# Altium footprint library 3D封装库.PcbLib: 716 footprints (part 10 of 45)
Each footprint in its own frame and in the unit in brackets; x right, y up, seen from the top. Pads: shape width x height; smd on the part's side, far side on the other; paste and mask are expansions set on the pad; w line width, h text height; cw(c..) or ccw(c..) is an arc to the next point about the centre after c.
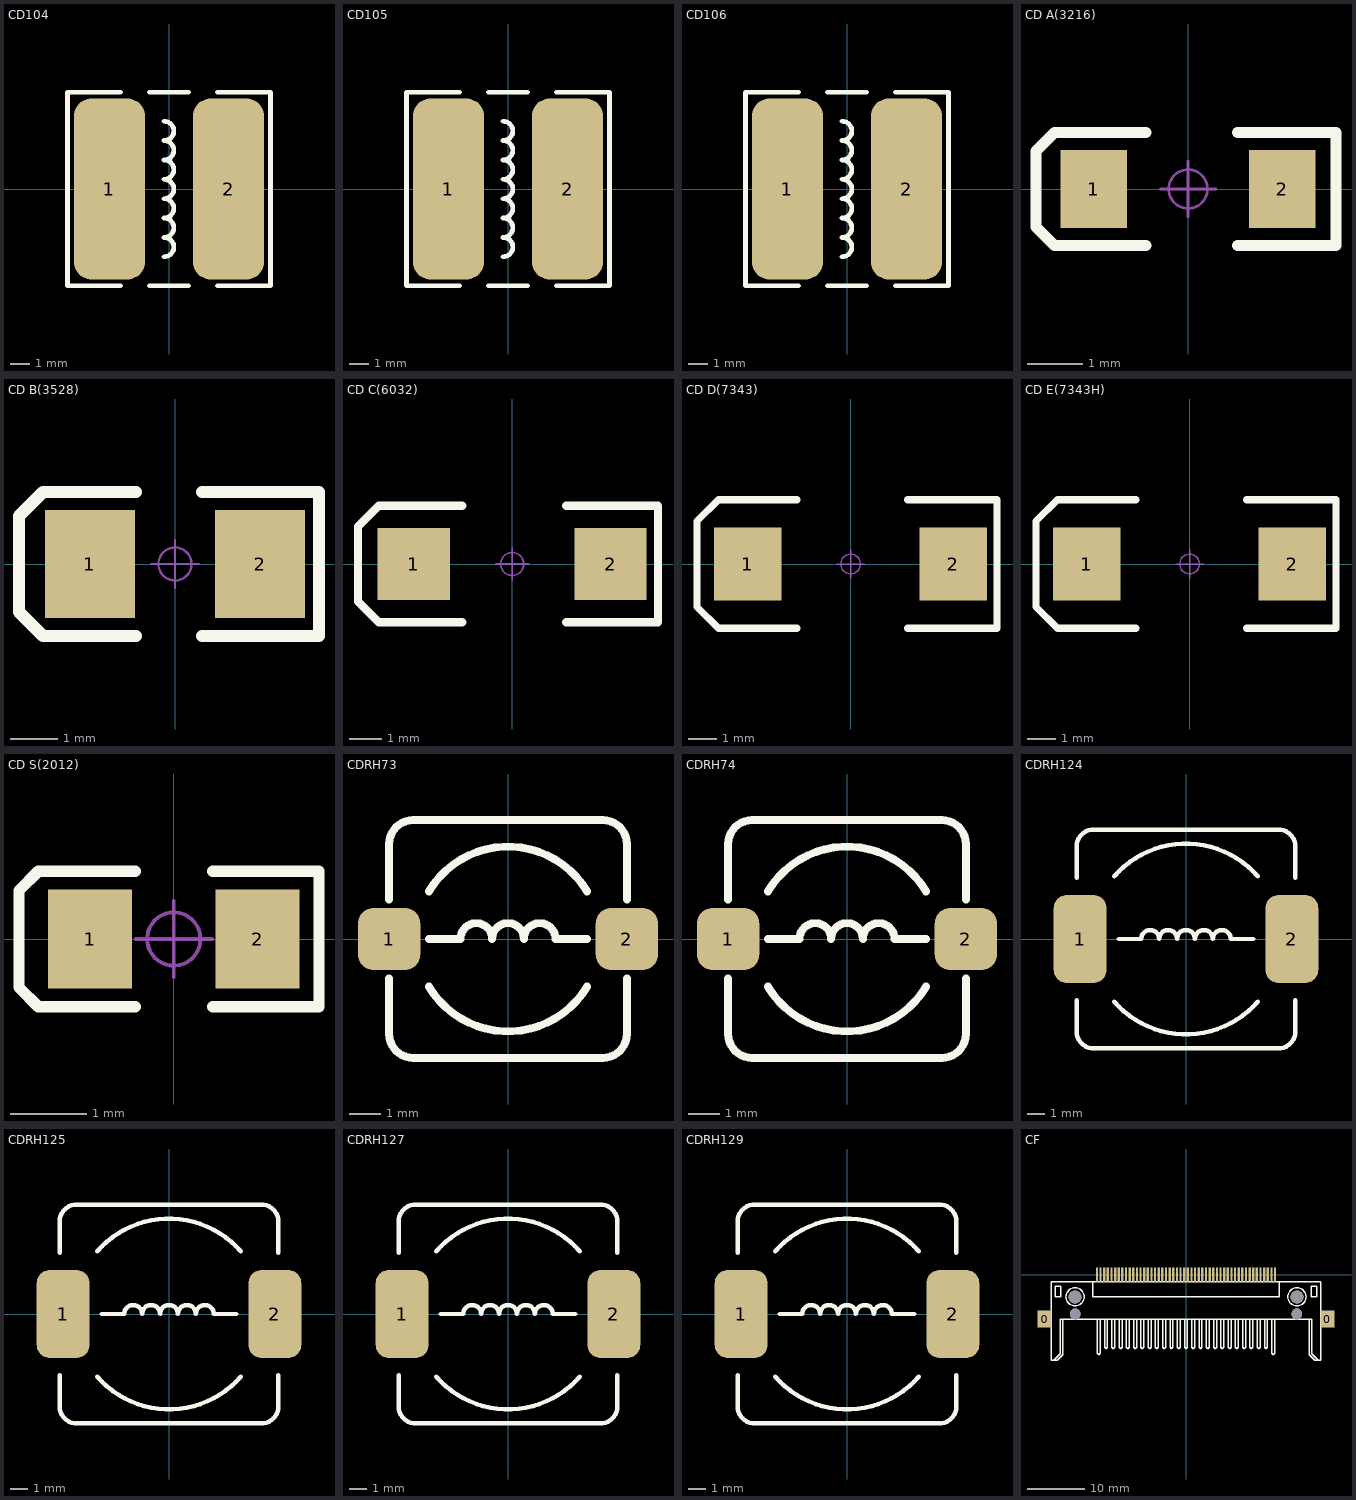
[diagram p9: the footprints below, top view; thin cyan lines are the x and y axes]

## CD104 [mm] "10*9*4mm（长宽高）"
pads (2):
  rrect50% 3.75x9.5 smd: 1(-3.125,0) 2(3.125,0)
Top Overlay:
  lines w0.254: -2.54,-5.08 -5.334,-5.08 -5.334,5.08 -2.54,5.08 ; -1.016,-5.08 1.016,-5.08 ; -1.016,5.08 1.016,5.08 ; -0.254,-3.556 ccw(c-0.254,-3.048) -0.254,-2.54 ccw(c-0.254,-2.032) -0.254,-1.524 ccw(c-0.254,-1.016) -0.254,-0.508 ccw(c-0.254,0) -0.254,0.508 ccw(c-0.254,1.016) -0.254,1.524 ccw(c-0.254,2.032) -0.254,2.54 ccw(c-0.254,3.048) -0.254,3.556 ; 2.54,-5.08 5.334,-5.08 5.334,5.08 2.54,5.08
3D body "CD104.STEP": height 4.7, standoff 0, extent -4.954,-4.5 4.954,4.5

## CD105 [mm] "10*9*5.4mm（长宽高）"
pads (2):
  rrect50% 3.75x9.5 smd: 1(-3.125,0) 2(3.125,0)
Top Overlay:
  lines w0.254: -2.54,-5.08 -5.334,-5.08 -5.334,5.08 -2.54,5.08 ; -1.016,-5.08 1.016,-5.08 ; -1.016,5.08 1.016,5.08 ; -0.254,-3.556 ccw(c-0.254,-3.048) -0.254,-2.54 ccw(c-0.254,-2.032) -0.254,-1.524 ccw(c-0.254,-1.016) -0.254,-0.508 ccw(c-0.254,0) -0.254,0.508 ccw(c-0.254,1.016) -0.254,1.524 ccw(c-0.254,2.032) -0.254,2.54 ccw(c-0.254,3.048) -0.254,3.556 ; 2.54,-5.08 5.334,-5.08 5.334,5.08 2.54,5.08
3D body "CD105.STEP": height 5.5, standoff 0, extent -4.954,-4.5 4.954,4.5

## CD106 [mm] "10*9*6.5mm（长宽高）"
pads (2):
  rrect50% 3.75x9.5 smd: 1(-3.125,0) 2(3.125,0)
Top Overlay:
  lines w0.254: -2.54,-5.08 -5.334,-5.08 -5.334,5.08 -2.54,5.08 ; -1.016,-5.08 1.016,-5.08 ; -1.016,5.08 1.016,5.08 ; -0.254,-3.556 ccw(c-0.254,-3.048) -0.254,-2.54 ccw(c-0.254,-2.032) -0.254,-1.524 ccw(c-0.254,-1.016) -0.254,-0.508 ccw(c-0.254,0) -0.254,0.508 ccw(c-0.254,1.016) -0.254,1.524 ccw(c-0.254,2.032) -0.254,2.54 ccw(c-0.254,3.048) -0.254,3.556 ; 2.54,-5.08 5.334,-5.08 5.334,5.08 2.54,5.08
3D body "CD106.STEP": height 6.3, standoff 0, extent -4.954,-4.5 4.954,4.5

## CD A(3216) [mm] "长3.2mm，宽1.6mm，厚1.6mm"
pads (2):
  rect 1.2x1.4 smd: 1(-1.7,0) 2(1.7,0)
Top Overlay:
  lines w0.2: -0.762,-1.016 -2.413,-1.016 -2.743,-0.686 -2.743,0.686 -2.413,1.016 -0.762,1.016 ; 0.889,-1.016 2.667,-1.016 2.667,1.016 0.889,1.016
Mechanical 15:
  circle w0.05: c0,0 r0.35
  lines w0.05: -0.5,0 0.5,0 ; 0,-0.5 0,0.5
3D body "CD A(3216).STEP": height 1.6, standoff -0.01, extent -1.6,-0.8 1.6,0.8

## CD B(3528) [mil] "长3.5mm，宽2.8mm，厚1.9mm"
pads (2):
  rect 75x90 smd: 1(-70.87,-0.01) 2(70.86,-0.01)
Top Overlay:
  lines w10: -32.51,-60 -110,-60 -130,-40 -130,40 -110,60 -32.51,60 ; 22.49,-60 120,-60 120,60 22.49,60
Mechanical 15:
  circle w1.97: c0,0 r13.78
  lines w1.97: -19.68,0 19.68,0 ; 0,-19.68 0,19.68
3D body "CD B(3528).STEP": height 74.84, standoff -0.3, extent -68.92,-55.12 68.91,55.11

## CD C(6032) [mm] "长6.0mm，宽3.2mm，厚2.5mm"
pads (2):
  rect 2.2x2.2 smd: 1(-3,0) 2(3,0)
Top Overlay:
  lines w0.254: -1.524,-1.778 -4.064,-1.778 -4.699,-1.143 -4.699,1.143 -4.064,1.778 -1.524,1.778 ; 1.651,-1.778 4.445,-1.778 4.445,1.778 1.651,1.778
Mechanical 15:
  circle w0.05: c0,0 r0.35
  lines w0.05: -0.5,0 0.5,0 ; 0,-0.5 0,0.5
3D body "CD C(6032).STEP": height 2.5, standoff -0.01, extent -3,-1.6 3,1.6

## CD D(7343) [mm] "长7.3mm，宽4.3mm，厚2.8mm"
pads (2):
  rect 2.4x2.6 smd: 1(-3.65,0) 2(3.65,0)
Top Overlay:
  lines w0.254: -1.905,-2.286 -4.699,-2.286 -5.461,-1.524 -5.461,1.524 -4.699,2.286 -1.905,2.286 ; 2.032,-2.286 5.207,-2.286 5.207,2.286 2.032,2.286
Mechanical 15:
  circle w0.05: c0,0 r0.35
  lines w0.05: -0.5,0 0.5,0 ; 0,-0.5 0,0.5
3D body "CD D(7343H).STEP": height 2.8, standoff -0.01, extent -3.65,-2.15 3.65,2.15

## CD E(7343H) [mm] "长7.3mm，宽4.3mm，厚4.0mm"
pads (2):
  rect 2.4x2.6 smd: 1(-3.65,0) 2(3.65,0)
Top Overlay:
  lines w0.254: -1.905,-2.286 -4.699,-2.286 -5.461,-1.524 -5.461,1.524 -4.699,2.286 -1.905,2.286 ; 2.032,-2.286 5.207,-2.286 5.207,2.286 2.032,2.286
Mechanical 15:
  circle w0.05: c0,0 r0.35
  lines w0.05: -0.5,0 0.5,0 ; 0,-0.5 0,0.5
3D body "CD E(7343H).STEP": height 4, standoff -0.01, extent -3.65,-2.15 3.65,2.15

## CD S(2012) [mm] "长2.0mm，宽1.25mm，厚1.2mm"
pads (2):
  rect 1.1x1.3 smd: 1(-1.1,0) 2(1.1,0)
Top Overlay:
  lines w0.15: -0.508,-0.889 -1.778,-0.889 -2.032,-0.635 -2.032,0.254 -2.032,0.635 -1.778,0.889 -0.508,0.889 ; 0.508,-0.889 1.905,-0.889 1.905,0.889 0.508,0.889
Mechanical 15:
  circle w0.05: c0,0 r0.35
  lines w0.05: -0.5,0 0.5,0 ; 0,-0.5 0,0.5
3D body "CD S(2012).STEP": height 1.2, standoff 0, extent -1,-0.6 1,0.6

## CDRH73 [mm] "7.3*7.3*3.4mm（长宽高）"
pads (2):
  rrect50% 2x2 smd: 1(-3.81,0) 2(3.81,0)
Top Overlay:
  lines w0.254: -3.81,-1.27 -3.81,-3.048 ccw(c-3.048,-3.048) -3.048,-3.81 3.048,-3.81 ccw(c3.048,-3.048) 3.81,-3.048 3.81,-1.27 ; -3.81,1.27 -3.81,3.048 cw(c-3.048,3.048) -3.048,3.81 3.048,3.81 cw(c3.048,3.048) 3.81,3.048 3.81,1.27 ; -2.54,-1.524 ccw(c0,0) 2.54,-1.524 ; -2.54,0 -1.524,0 cw(c-1.016,0) -0.508,0 cw(c0,0) 0.508,0 cw(c1.016,0) 1.524,0 2.54,0 ; -2.54,1.524 cw(c0,0) 2.54,1.524
3D body "CDRH73.STEP": height 3.65, standoff 0, extent -3.65,-3.65 3.65,3.65

## CDRH74 [mm] "7.3*7.3*4.5mm（长宽高）"
pads (2):
  rrect50% 2x2 smd: 1(-3.81,0) 2(3.81,0)
Top Overlay:
  lines w0.254: -3.81,-1.27 -3.81,-3.048 ccw(c-3.048,-3.048) -3.048,-3.81 3.048,-3.81 ccw(c3.048,-3.048) 3.81,-3.048 3.81,-1.27 ; -3.81,1.27 -3.81,3.048 cw(c-3.048,3.048) -3.048,3.81 3.048,3.81 cw(c3.048,3.048) 3.81,3.048 3.81,1.27 ; -2.54,-1.524 ccw(c0,0) 2.54,-1.524 ; -2.54,0 -1.524,0 cw(c-1.016,0) -0.508,0 cw(c0,0) 0.508,0 cw(c1.016,0) 1.524,0 2.54,0 ; -2.54,1.524 cw(c0,0) 2.54,1.524
3D body "CDRH74.STEP": height 4.5, standoff 0, extent -3.65,-3.65 3.65,3.65

## CDRH124 [mm] "12*12*4.5mm（长宽高）"
pads (2):
  rrect50% 3x5 smd: 1(-6,0) 2(6,0)
Top Overlay:
  lines w0.254: -6.2,-3.475 -6.2,-5.23 ccw(c-5.23,-5.23) -5.23,-6.2 5.23,-6.2 ccw(c5.23,-5.23) 6.2,-5.23 6.2,-3.475 ; -6.2,3.475 -6.2,5.23 cw(c-5.23,5.23) -5.23,6.2 5.23,6.2 cw(c5.23,5.23) 6.2,5.23 6.2,3.475 ; -4.064,-3.556 ccw(c0,0) 4.064,-3.556 ; -4.064,3.556 cw(c0,0) 4.064,3.556 ; -3.81,0 -2.54,0 cw(c-2.032,0) -1.524,0 cw(c-1.016,0) -0.508,0 cw(c0,0) 0.508,0 cw(c1.016,0) 1.524,0 cw(c2.032,0) 2.54,0 3.81,0
3D body "CDRH124.STEP": height 4.55, standoff 0.05, extent -6,-6 6,6

## CDRH125 [mm] "12*12*5mm（长宽高）"
pads (2):
  rrect50% 3x5 smd: 1(-6,0) 2(6,0)
Top Overlay:
  lines w0.254: -6.2,-3.475 -6.2,-5.23 ccw(c-5.23,-5.23) -5.23,-6.2 5.23,-6.2 ccw(c5.23,-5.23) 6.2,-5.23 6.2,-3.475 ; -6.2,3.475 -6.2,5.23 cw(c-5.23,5.23) -5.23,6.2 5.23,6.2 cw(c5.23,5.23) 6.2,5.23 6.2,3.475 ; -4.064,-3.556 ccw(c0,0) 4.064,-3.556 ; -4.064,3.556 cw(c0,0) 4.064,3.556 ; -3.81,0 -2.54,0 cw(c-2.032,0) -1.524,0 cw(c-1.016,0) -0.508,0 cw(c0,0) 0.508,0 cw(c1.016,0) 1.524,0 cw(c2.032,0) 2.54,0 3.81,0
3D body "CDRH125.STEP": height 5.05, standoff 0.05, extent -6,-6 6,6

## CDRH127 [mm] "12*12*8mm（长宽高）"
pads (2):
  rrect50% 3x5 smd: 1(-6,0) 2(6,0)
Top Overlay:
  lines w0.254: -6.2,-3.475 -6.2,-5.23 ccw(c-5.23,-5.23) -5.23,-6.2 5.23,-6.2 ccw(c5.23,-5.23) 6.2,-5.23 6.2,-3.475 ; -6.2,3.475 -6.2,5.23 cw(c-5.23,5.23) -5.23,6.2 5.23,6.2 cw(c5.23,5.23) 6.2,5.23 6.2,3.475 ; -4.064,-3.556 ccw(c0,0) 4.064,-3.556 ; -4.064,3.556 cw(c0,0) 4.064,3.556 ; -3.81,0 -2.54,0 cw(c-2.032,0) -1.524,0 cw(c-1.016,0) -0.508,0 cw(c0,0) 0.508,0 cw(c1.016,0) 1.524,0 cw(c2.032,0) 2.54,0 3.81,0
3D body "CDRH127.STEP": height 7.8, standoff 0, extent -6,-6 6,6

## CDRH129 [mm] "12*12*9.5mm（长宽高）"
pads (2):
  rrect50% 3x5 smd: 1(-6,0) 2(6,0)
Top Overlay:
  lines w0.254: -6.2,-3.475 -6.2,-5.23 ccw(c-5.23,-5.23) -5.23,-6.2 5.23,-6.2 ccw(c5.23,-5.23) 6.2,-5.23 6.2,-3.475 ; -6.2,3.475 -6.2,5.23 cw(c-5.23,5.23) -5.23,6.2 5.23,6.2 cw(c5.23,5.23) 6.2,5.23 6.2,3.475 ; -4.064,-3.556 ccw(c0,0) 4.064,-3.556 ; -4.064,3.556 cw(c0,0) 4.064,3.556 ; -3.81,0 -2.54,0 cw(c-2.032,0) -1.524,0 cw(c-1.016,0) -0.508,0 cw(c0,0) 0.508,0 cw(c1.016,0) 1.524,0 cw(c2.032,0) 2.54,0 3.81,0
3D body "CDRH129.STEP": height 9.65, standoff 0.05, extent -6,-6 6,6

## CF [mm]
pads (52):
  rect 2.5x3 smd: 0(-24.7,-7.75) 0(24.7,-7.75)
  rect 0.4x2.5 smd: 1(-15.557,0) 2(-14.287,0) 3(-13.018,0) 4(-11.747,0) 5(-10.477,0) 6(-9.207,0) 7(-7.938,0) 8(-6.667,0) 9(-5.397,0) 10(-4.127,0) 11(-2.857,0) 12(-1.587,0) 13(-0.318,0) 14(0.953,0) 15(2.222,0) 16(3.492,0) 17(4.763,0) 18(6.032,0) 19(7.302,0) 20(8.572,0) 21(9.842,0) 22(11.112,0) 23(12.383,0) 24(13.652,0) 25(14.922,0) 26(-14.922,0) 27(-13.652,0) 28(-12.383,0) 29(-11.112,0) 30(-9.842,0) 31(-8.572,0) 32(-7.302,0) 33(-6.032,0) 34(-4.763,0) 35(-3.492,0) 36(-2.222,0) 37(-0.953,0) 38(0.318,0) 39(1.587,0) 40(2.857,0) 41(4.127,0) 42(5.397,0) 43(6.667,0) 44(7.938,0) 45(9.207,0) 46(10.477,0) 47(11.747,0) 48(13.018,0) 49(14.287,0) 50(15.557,0)
via 19.37,-6.85 diameter 1.85 hole 1.85
via -19.37,-6.85 diameter 1.85 hole 1.85
via 19.37,-3.85 diameter 2.25 hole 2.25
via -19.37,-3.85 diameter 2.25 hole 2.25
Top Overlay:
  circle w0.254: c-19.37,-3.85 r1.591
  circle w0.254: c19.37,-3.85 r1.591
  lines w0.254: -23.114,-14.95 -21.968,-13.804 -21.968,-7.75 -21.5,-7.75 ; -21.535,-13.97 -22.515,-14.95 -23.5,-14.95 -23.5,-1.25 23.5,-1.25 ; -21.5,-13.97 -21.5,-7.75 ; -16.256,-1.25 -16.256,-3.81 16.256,-3.81 16.256,-1.25 ; -15.494,-7.75 -15.494,-13.716 -15.24,-13.97 -14.986,-13.716 -14.986,-7.75 ; -14.224,-7.75 -14.224,-12.7 -13.97,-12.954 -13.716,-12.7 -13.716,-7.75 ; -12.954,-7.75 -12.954,-12.7 -12.7,-12.954 -12.446,-12.7 -12.446,-7.75 ; -11.684,-7.75 -11.684,-12.7 -11.43,-12.954 -11.176,-12.7 -11.176,-7.75 ; -10.414,-7.75 -10.414,-12.7 -10.16,-12.954 -9.906,-12.7 -9.906,-7.75 ; -9.144,-7.75 -9.144,-12.7 -8.89,-12.954 -8.636,-12.7 -8.636,-7.75 ; -7.874,-7.75 -7.874,-12.7 -7.62,-12.954 -7.366,-12.7 -7.366,-7.75 ; -6.604,-7.75 -6.604,-12.7 -6.35,-12.954 -6.096,-12.7 -6.096,-7.75 ; -5.334,-7.75 -5.334,-12.7 -5.08,-12.954 -4.826,-12.7 -4.826,-7.75 ; -4.064,-7.75 -4.064,-12.7 -3.81,-12.954 -3.556,-12.7 -3.556,-7.75 ; -2.794,-7.75 -2.794,-12.7 -2.54,-12.954 -2.286,-12.7 -2.286,-7.75 ; -1.524,-7.75 -1.524,-12.7 -1.27,-12.954 -1.016,-12.7 -1.016,-7.75 ; -0.254,-7.75 -0.254,-12.7 0,-12.954 0.254,-12.7 0.254,-7.75 ; 1.016,-7.75 1.016,-12.7 1.27,-12.954 1.524,-12.7 1.524,-7.75 ; 2.286,-7.75 2.286,-12.7 2.54,-12.954 2.794,-12.7 2.794,-7.75 ; 3.556,-7.75 3.556,-12.7 3.81,-12.954 4.064,-12.7 4.064,-7.75 ; 4.826,-7.75 4.826,-12.7 5.08,-12.954 5.334,-12.7 5.334,-7.75 ; 6.096,-7.75 6.096,-12.7 6.35,-12.954 6.604,-12.7 6.604,-7.75 ; 7.366,-7.75 7.366,-12.7 7.62,-12.954 7.874,-12.7 7.874,-7.75 ; 8.636,-7.75 8.636,-12.7 8.89,-12.954 9.144,-12.7 9.144,-7.75 ; 9.906,-7.75 9.906,-12.7 10.16,-12.954 10.414,-12.7 10.414,-7.75 ; 11.176,-7.75 11.176,-12.7 11.43,-12.954 11.684,-12.7 11.684,-7.75 ; 12.446,-7.75 12.446,-12.7 12.7,-12.954 12.954,-12.7 12.954,-7.75 ; 13.716,-7.75 13.716,-12.7 13.97,-12.954 14.224,-12.7 14.224,-7.75 ; 14.986,-7.75 14.986,-13.716 15.24,-13.97 15.494,-13.716 15.494,-7.75 ; 21.5,-13.97 21.5,-7.75 ; 21.535,-13.97 22.515,-14.95 23.5,-14.95 23.5,-1.27 ; 23.114,-14.95 21.968,-13.804 21.968,-7.75 21.5,-7.75 ; -21.5,-7.75 21.5,-7.75 ; -22.86,-3.81 -22.86,-2.032 -21.844,-2.032 -21.844,-3.81 -22.86,-3.81 ; 21.844,-3.81 21.844,-2.032 22.86,-2.032 22.86,-3.81 21.844,-3.81